# Altium footprint library Excavator_part_PCB.PcbLib: 22 footprints (part 1 of 2)
Each footprint in its own frame and in the unit in brackets; x right, y up, seen from the top. Pads: shape width x height; smd on the part's side, far side on the other; paste and mask are expansions set on the pad; w line width, h text height; cw(c..) or ccw(c..) is an arc to the next point about the centre after c.
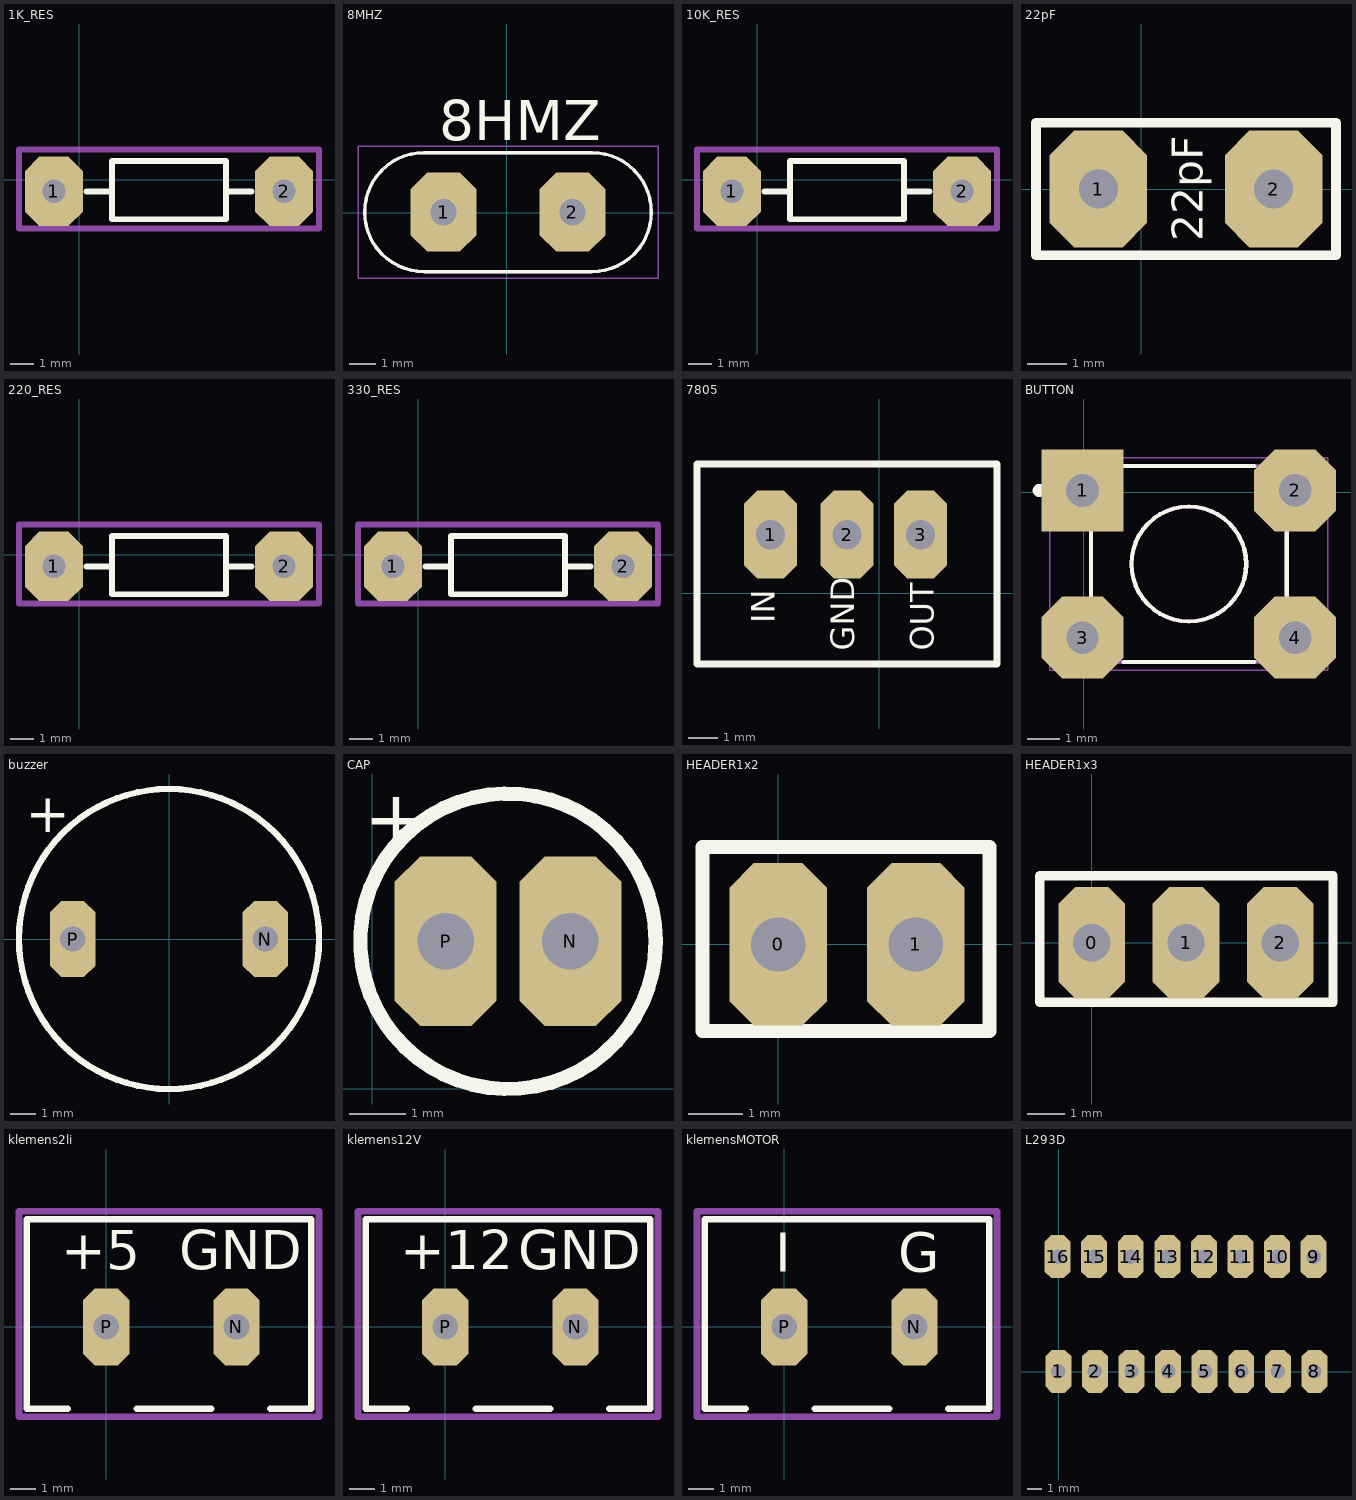
[diagram p0: the footprints below, top view; thin cyan lines are the x and y axes]

## 1K_RES [mm]
pads (2):
  oct 2.5x3 hole 1: 1(-1.1,-0.5) 2(8.8,-0.5)
Top Overlay:
  lines w0.254: 0.3,-0.5 1.4,-0.5 ; 6.3,-0.5 7.4,-0.5 ; 6.3,-1.7 1.4,-1.7 1.4,0.8 6.3,0.8 ; 6.3,-1.7 6.3,0.8 ; 6.3,-1.7 6.3,0.8
Mechanical 15:
  lines w0.254: -2.6,-2.1 -2.6,1.3 -2.4,1.3 10.3,1.3 10.3,-2.1 -1.9,-2.1 -2.6,-2.1
3D body "RES-0.25W-H-CF.stp": height 2.69, standoff -2.5, extent -1.453,-1.797 9.255,0.797

## 8MHZ [mm]
pads (2):
  oct 2.5x3 hole 1: 1(-2.393,0.03) 2(2.487,0.03)
Top Overlay:
  lines w0.127: -5.378,0.03 ccw(c-3.128,0.03) -3.128,-2.22 3.222,-2.22 ccw(c3.222,0.03) 5.472,0.03 ccw(c3.222,0.03) 3.222,2.28 -3.128,2.28 ccw(c-3.128,0.03) -5.378,0.03
  text "8HMZ" at -2.546,2.754 h1.52
Mechanical 13:
  lines w0.127: -5.378,0.03 ccw(c-3.128,0.03) -3.128,-2.22 3.222,-2.22 ccw(c3.222,0.03) 5.472,0.03 ccw(c3.222,0.03) 3.222,2.28 -3.128,2.28 ccw(c-3.128,0.03) -5.378,0.03
Mechanical 15:
  lines w0.05: -5.628,-2.47 5.722,-2.47 5.722,2.53 -5.628,2.53 -5.628,-2.47
3D body "HC-49S.stp": height 4, standoff -3, extent -5.5,-2.3 5.7,2.55

## 10K_RES [mm]
pads (2):
  oct 2.5x3 hole 1: 1(-1.1,-0.5) 2(8.8,-0.5)
Top Overlay:
  lines w0.254: 0.3,-0.5 1.4,-0.5 ; 6.3,-0.5 7.4,-0.5 ; 6.3,-1.7 1.4,-1.7 1.4,0.8 6.3,0.8 ; 6.3,-1.7 6.3,0.8 ; 6.3,-1.7 6.3,0.8
Mechanical 15:
  lines w0.254: -2.6,-2.1 -2.6,1.3 -2.4,1.3 10.3,1.3 10.3,-2.1 -1.9,-2.1 -2.6,-2.1
3D body "10K RES.STEP": height 2.7, standoff -2.5, extent -1.4,-1.7 9.31,0.9

## 22pF [mm]
pads (2):
  oct 2.5x3 hole 1: 1(-1.1,0) 2(3.4,0)
Top Overlay:
  lines w0.254: -2.7,-1.7 5,-1.7 5,1.7 -1.8,1.7 -2.7,1.7 -2.7,-1.7
  text "22pF" at 1.579,-1.346 h0.8
3D body "CAP_DISC_4x3_YL.stp": height 4.47, standoff -3, extent -1.625,-1.5 3.825,1.5

## 220_RES [mm]
pads (2):
  oct 2.5x3 hole 1: 1(-1.1,-0.5) 2(8.8,-0.5)
Top Overlay:
  lines w0.254: 0.3,-0.5 1.4,-0.5 ; 6.3,-0.5 7.4,-0.5 ; 6.3,-1.7 1.4,-1.7 1.4,0.8 6.3,0.8 ; 6.3,-1.7 6.3,0.8 ; 6.3,-1.7 6.3,0.8
Mechanical 15:
  lines w0.254: -2.6,-2.1 -2.6,1.3 -2.4,1.3 10.3,1.3 10.3,-2.1 -1.9,-2.1 -2.6,-2.1
3D body "220 RES.STEP": height 2.7, standoff -2.5, extent -1.655,-1.8 9.055,0.8

## 330_RES [mm]
pads (2):
  oct 2.5x3 hole 1: 1(-1.1,-0.5) 2(8.8,-0.5)
Top Overlay:
  lines w0.254: 0.3,-0.5 1.4,-0.5 ; 6.3,-0.5 7.4,-0.5 ; 6.3,-1.7 6.3,0.8 ; 6.3,-1.7 6.3,0.8 ; 6.3,-1.7 1.4,-1.7 1.4,0.8 6.3,0.8
Mechanical 15:
  lines w0.254: -2.6,-2.1 -1.9,-2.1 10.3,-2.1 10.3,1.3 -2.4,1.3 -2.6,1.3 -2.6,-2.1
3D body "330 RES.STEP": height 2.7, standoff -2.5, extent -1.71,-1.7 9,0.9

## 7805 [mm]
pads (3):
  oct 1.8x3 hole 1: 1(-3.7,2) 2(-1.1,2) 3(1.4,2)
Top Overlay:
  lines w0.254: -6.2,-2.4 4,-2.4 4,4.4 -6.2,4.4 -6.2,-2.4
  text "OUT" at 1.846,-1.946 h0.8
  text "GND" at -0.854,-1.946 h0.8
  text "IN" at -3.554,-1.013 h0.8
3D body "7805VoltageRegulator.STEP": height 20.55, standoff -8.15, extent -6.21,0.55 4.01,4.5

## BUTTON [mm]
pads (4):
  rect 2.5x2.5 hole 1: 1(-0.044,0.054)
  oct 2.5x2.5 hole 0.99: 2(6.456,0.054) 3(-0.044,-4.446) 4(6.456,-4.446)
Top Overlay:
  circle w0.127: c3.206,-2.196 r1.755
  circle w0.2: c-1.366,0.054 r0.1
  lines w0.127: 0.211,-3.196 0.211,-1.196 ; 1.206,-5.191 5.206,-5.191 ; 1.206,0.799 5.206,0.799 ; 6.201,-3.196 6.201,-1.196
Mechanical 13:
  circle w0.127: c3.206,-2.196 r1.755
  lines w0.127: 0.211,-5.191 0.211,0.799 6.201,0.799 6.201,-5.191 0.211,-5.191
Mechanical 15:
  lines w0.05: -1.044,-5.446 -1.044,1.054 7.456,1.054 7.456,-5.446 -1.044,-5.446
3D body "tactileswitch-short.STEP": height 4.95, standoff -3.38, extent -0.591,-5.204 7.1,0.804

## buzzer [mm]
pads (2):
  oct 1.8x3 hole 1: N(3.8,0) P(-3.8,0)
Top Overlay:
  circle w0.254: c0,0 r5.914
  text "+" at -5.646,4.2 h1.52
3D body "buzzer.stp": height 9.5, standoff -5.5, extent -6,-6 6,6

## CAP [mm]
pads (2):
  oct 1.8x3 hole 1: N(3.5,2.6) P(1.3,2.6)
Top Overlay:
  circle w0.254: c2.4,2.6 r2.608
  text "+" at -0.146,4.287 h1
3D body "CAP_RAD_D5x11_POL_BK.stp": height 12.5, standoff -2.5, extent -0.4,-0.2 5.1,5.3

## HEADER1x2 [mm]
pads (2):
  oct 1.8x3 hole 1: 0(0,0) 1(2.54,0)
Top Overlay:
  lines w0.254: -1.4,-1.6 -1.3,-1.6 3.9,-1.6 3.9,1.8 -1.4,1.8 -1.4,1.5 -1.4,-1.6
3D body "Pin Header 1x2 TH Pitch 2.54mm.stp": height 9.5, standoff -3.2, extent -1.27,-1.27 3.81,1.27

## HEADER1x3 [mm]
pads (3):
  oct 1.8x3 hole 1: 0(0,0) 1(2.54,0) 2(5.08,0)
Top Overlay:
  lines w0.254: -1.4,-1.6 -1.3,-1.6 6.5,-1.6 6.5,1.8 -1.4,1.8 -1.4,1.5 -1.4,-1.6
3D body "Pin Header 1x3 TH Pitch 2.54mm.stp": height 9.5, standoff -3.2, extent -1.27,-1.27 6.35,1.27

## klemens2li [mm]
pads (2):
  oct 1.8x3 hole 1: N(5.08,0) P(0,0)
Top Overlay:
  lines w0.254: -1.5,-3.2 -3.1,-3.2 -3.1,4.2 8,4.2 8,-3.2 6.4,-3.2 ; 1.2,-3.2 4.1,-3.2
  text "GND" at 2.854,2.254 h1.52
  text "+5" at -1.746,2.254 h1.52
Mechanical 15:
  lines w0.254: -3.4,-3.5 -3.4,4.5 8.3,4.5 8.3,-3.5 -3.4,-3.5
3D body "klememns2 li.STEP": height 10, standoff -3.5, extent -3.08,-3.3 8.08,4.2

## klemens12V [mm]
pads (2):
  oct 1.8x3 hole 1: N(5.08,0) P(0,0)
Top Overlay:
  lines w0.254: -1.5,-3.2 -3.1,-3.2 -3.1,4.2 8,4.2 8,-3.2 6.4,-3.2 ; 1.2,-3.2 4.1,-3.2
  text "+12" at -1.746,2.254 h1.52
  text "GND" at 2.854,2.254 h1.52
Mechanical 15:
  lines w0.254: -3.4,-3.5 8.3,-3.5 8.3,4.5 -3.4,4.5 -3.4,-3.5
3D body "klememns2 li.STEP": height 10, standoff -3.5, extent -3.08,-3.3 8.08,4.2

## klemensMOTOR [mm]
pads (2):
  oct 1.8x3 hole 1: N(5.08,0) P(0,0)
Top Overlay:
  lines w0.254: -1.5,-3.2 -3.1,-3.2 -3.1,4.2 8,4.2 8,-3.2 6.4,-3.2 ; 1.2,-3.2 4.1,-3.2
  text "G" at 4.454,2.154 h1.52
  text "I" at -0.346,2.154 h1.52
Mechanical 15:
  lines w0.254: -3.4,-3.5 -3.4,4.5 8.3,4.5 8.3,-3.5 -3.4,-3.5
3D body "klememns2 li.STEP": height 10, standoff -3.5, extent -3.08,-3.3 8.08,4.2

## L293D [mm] "MotorDriver"
pads (16):
  oct 1.8x3 hole 1: 1(-0.025,0.025) 2(2.515,0.025) 3(5.055,0.025) 4(7.595,0.025) 5(10.135,0.025) 6(12.675,0.025) 7(15.215,0.025) 8(17.755,0.025) 9(17.705,8) 10(15.165,8) 11(12.625,8) 12(10.085,8) 13(7.545,8) 14(5.005,8) 15(2.465,8) 16(-0.075,8)
3D body "L293D v1.STEP": height 4.6, standoff -2.5, extent -1.2,-0.5 18.8,8.7